# Altium integrated library Diode.IntLib: 8 symbols
Pins are listed as number, name and electrical type; pins without a type are passive.

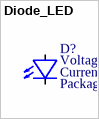
[diagram p0: symbol Diode_LED]

## Diode_LED
designator D?
Component Category: Diode; ComponentLink1Description: Datasheet; ComponentLink1URL: *; ComponentLink2Description: Supplier Link; ComponentLink2URL: *; Component Type: Rectifier; Supplier Link: *; Supplier Currency: *; Price, Max: *; Price, Min: *; Quantity, Max: *; Quantity, Min: *; Operating Temperature, Max: *℃; Operating Temperature, Min: *℃; Supplier Part Number: *; Supplier: *; Manufacturer Part Number: *; Manufacturer: *; Current: *; Package: *; Voltage: *
footprint Diode_SMD_M1608_I0603_Blue (Diode, LED, Blue, SMD, M1608, I0603)
footprint Diode_SMD_M1608_I0603_Green (Diode, LED, Green, SMD, M1608, I0603)
footprint Diode_SMD_M1608_I0603_Green_Yellow (Diode, LED, Green-Yelow, SMD, M1608, I0603)
footprint Diode_SMD_M1608_I0603_Red (Diode, LED, Red, SMD, M1608, I0603)
footprint Diode_SMD_M1608_I0603_Orange_1 (Diode, LED, Orange 1, SMD, M1608, I0603)
footprint Diode_SMD_M1608_I0603_Orange_2 (Diode, LED, Orange 2, SMD, M1608, I0603)
footprint Diode_SMD_M1608_I0603_White (Diode, LED, White, SMD, M1608, I0603)
footprint Diode_SMD_M1608_I0603_Yellow (Diode, LED, Yellow, SMD, M1608, I0603)
pins: A Anode, K Katode
8 alternate drawings of the same symbol


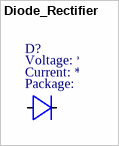
[diagram p1: symbol Diode_Rectifier]

## Diode_Rectifier
designator D?
Component Category: Diode; ComponentLink1Description: Datasheet; ComponentLink1URL: *; ComponentLink2Description: Supplier Link; ComponentLink2URL: *; Component Type: Rectifier; Supplier Link: *; Supplier Currency: *; Price, Max: *; Price, Min: *; Quantity, Max: *; Quantity, Min: *; Operating Temperature, Max: *℃; Operating Temperature, Min: *℃; Supplier Part Number: *; Supplier: *; Manufacturer Part Number: *; Manufacturer: *; Current: *; Package: *; Voltage: *
footprint Diode_SOD-523_SC-79 (Diode, SMD, SOD-523, SC-79)
footprint Diode_SOD-123F (Diode, SMD, SOD-123F)
pins: A Anode, K Katode


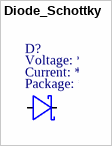
[diagram p2: symbol Diode_Schottky]

## Diode_Schottky
designator D?
Component Category: Diode; ComponentLink1Description: Datasheet; ComponentLink1URL: *; ComponentLink2Description: Supplier Link; ComponentLink2URL: *; Component Type: Rectifier; Supplier Link: *; Supplier Currency: *; Price, Max: *; Price, Min: *; Quantity, Max: *; Quantity, Min: *; Operating Temperature, Max: *℃; Operating Temperature, Min: *℃; Supplier Part Number: *; Supplier: *; Manufacturer Part Number: *; Manufacturer: *; Current: *; Package: *; Voltage: *
footprint Diode_SOD-523_SC-79 (Diode, SMD, SOD-523, SC-79)
footprint Diode_SOD-123F (Diode, SMD, SOD-123F)
pins: A Anode, K Katode


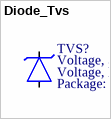
[diagram p3: symbol Diode_Tvs]

## Diode_Tvs
designator TVS?
Component Category: Diode; ComponentLink1Description: Datasheet; ComponentLink1URL: *; ComponentLink2Description: Supplier Link; ComponentLink2URL: *; Manufacturer Part Number: *; Supplier: *; Supplier Part Number: *; Manufacturer: *; Operating Temperature, Min: *℃; Operating Temperature, Max: *℃; Quantity, Min: *; Quantity, Max: *; Price, Min: *; Price, Max: *; Supplier Currency: *; Supplier Link: *; Component Type: Zener; Voltage, Break Down: *; Voltage, Stand Off: *; Package: *
footprint Diode_SOD-523_SC-79 (Diode, SMD, SOD-523, SC-79)
pins: A, K


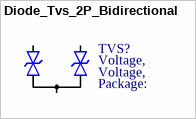
[diagram p4: symbol Diode_Tvs_2P_Bidirectional]

## Diode_Tvs_2P_Bidirectional
designator TVS?
Component Category: Diode; ComponentLink1Description: Datasheet; ComponentLink1URL: *; ComponentLink2Description: Supplier Link; ComponentLink2URL: *; Manufacturer Part Number: *; Supplier: *; Supplier Part Number: *; Manufacturer: *; Operating Temperature, Min: *℃; Operating Temperature, Max: *℃; Quantity, Min: *; Quantity, Max: *; Price, Min: *; Price, Max: *; Supplier Currency: *; Supplier Link: *; Component Type: TVS; Voltage, Break Down: *; Voltage, Stand Off: *; Package: *
footprint Diode_SOT-23-3_2P_Bidirectional_Type_1
pins: Common, D1, D2


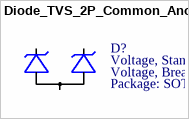
[diagram p5: symbol Diode_TVS_2P_Common_Anode]

## Diode_TVS_2P_Common_Anode
designator D?  Voltage, Break Down: 6.5V  Package: SOT-723  Voltage, Stand OFF: 5V  (hidden comment: *)
Manufacturer Part Number: DF3A6.8LFV,L3F; Manufacturer: Toshiba; Component Category: Diode; ComponentLink1Description: Datasheet; ComponentLink1URL: C:\Users\Public\Documents\Altium\env\Datasheets\Diode\Toshiba_DF3A6.8LFV_TVS_Diode.pdf; ComponentLink2Description: Supplier Link; ComponentLink2URL: https://www.digikey.com/en/products/detail/toshiba-semiconductor-and-storage/DF3A6-8LFV-L3F/4305070; Component Type: TVS; Supplier Link: https://www.digikey.com/en/products/detail/toshiba-semiconductor-and-storage/DF3A6-8LFV-L3F/4305070?s=N4IgTCBcDaICIDEDMBBAbAGgBwBkEDUMckEQBdAXyA; Supplier Currency: $; Price, Max: $0.02250; Price, Min: $0.14000; Quantity, Max: 8000; Quantity, Min: 1; Operating Temperature, Max: *℃; Operating Temperature, Min: *℃; Supplier Part Number: DF3A6.8LFVL3FCT-ND; Supplier: Digikey
footprint Diode_SOT-723_2P_Common_Anode_Type_1 (Diode, TVS, SMD, SOT-723, Common Anode, Type 1)
pins: A Anode, K1 Katode 1, K2 Katode 2


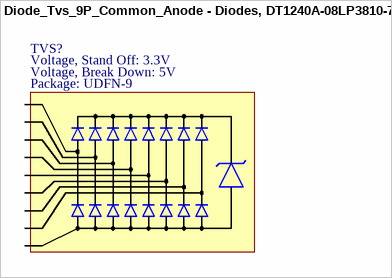
[diagram p6: symbol Diode_Tvs_9P_Common_Anode - Diodes, DT1240A-08LP3810-7]

## Diode_Tvs_9P_Common_Anode - Diodes, DT1240A-08LP3810-7
designator TVS?  Voltage, Break Down: 5V  Voltage, Stand Off: 3.3V  Package: UDFN-9  (hidden comment: *)
Manufacturer Part Number: DT1240A-08LP3810-7; Manufacturer: Diodes; Component Category: Diode; ComponentLink1Description: Datasheet; ComponentLink1URL: E:\Altium\Datasheets\Diode\Diodes, DT1240A-08LP3810-7.pdf; ComponentLink2Description: Supplier Link; ComponentLink2URL: https://www.digikey.com/en/products/detail/diodes-incorporated/dt1240a-08lp3810-7/8255867; Supplier: Digikey; Supplier Part Number: DT1240A-08LP3810-7DICT-ND; Operating Temperature, Min: -55℃; Operating Temperature, Max: +86℃; Quantity, Min: 1; Quantity, Max: 2500; Price, Min: 0.10245; Price, Max: 0.42; Supplier Currency: $; Supplier Link: https://www.digikey.com/en/products/detail/diodes-incorporated/dt1240a-08lp3810-7/8255867; Component Type: TVS
footprint Diode_Tvs_9P_Common_Anode - Diodes, DT1240A-08LP3810-7
pins: 1, 2, 3, 4, 5, 6, 7, 8, 9


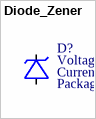
[diagram p7: symbol Diode_Zener]

## Diode_Zener
designator D?
Component Category: Diode; ComponentLink1Description: Datasheet; ComponentLink1URL: *; ComponentLink2Description: Supplier Link; ComponentLink2URL: *; Component Type: Rectifier; Supplier Link: *; Supplier Currency: *; Price, Max: *; Price, Min: *; Quantity, Max: *; Quantity, Min: *; Operating Temperature, Max: *℃; Operating Temperature, Min: *℃; Supplier Part Number: *; Supplier: *; Manufacturer Part Number: *; Manufacturer: *; Current: *; Package: *; Voltage: *
footprint Diode_SOD-523_SC-79 (Diode, SMD, SOD-523, SC-79)
footprint Diode_SOD-123F (Diode, SMD, SOD-123F)
pins: A Anode, K Katode